# Altium footprint library North POLE.PcbLib: 419 footprints (part 5 of 27)
Each footprint in its own frame and in the unit in brackets; x right, y up, seen from the top. Pads: shape width x height; smd on the part's side, far side on the other; paste and mask are expansions set on the pad; w line width, h text height; cw(c..) or ccw(c..) is an arc to the next point about the centre after c.
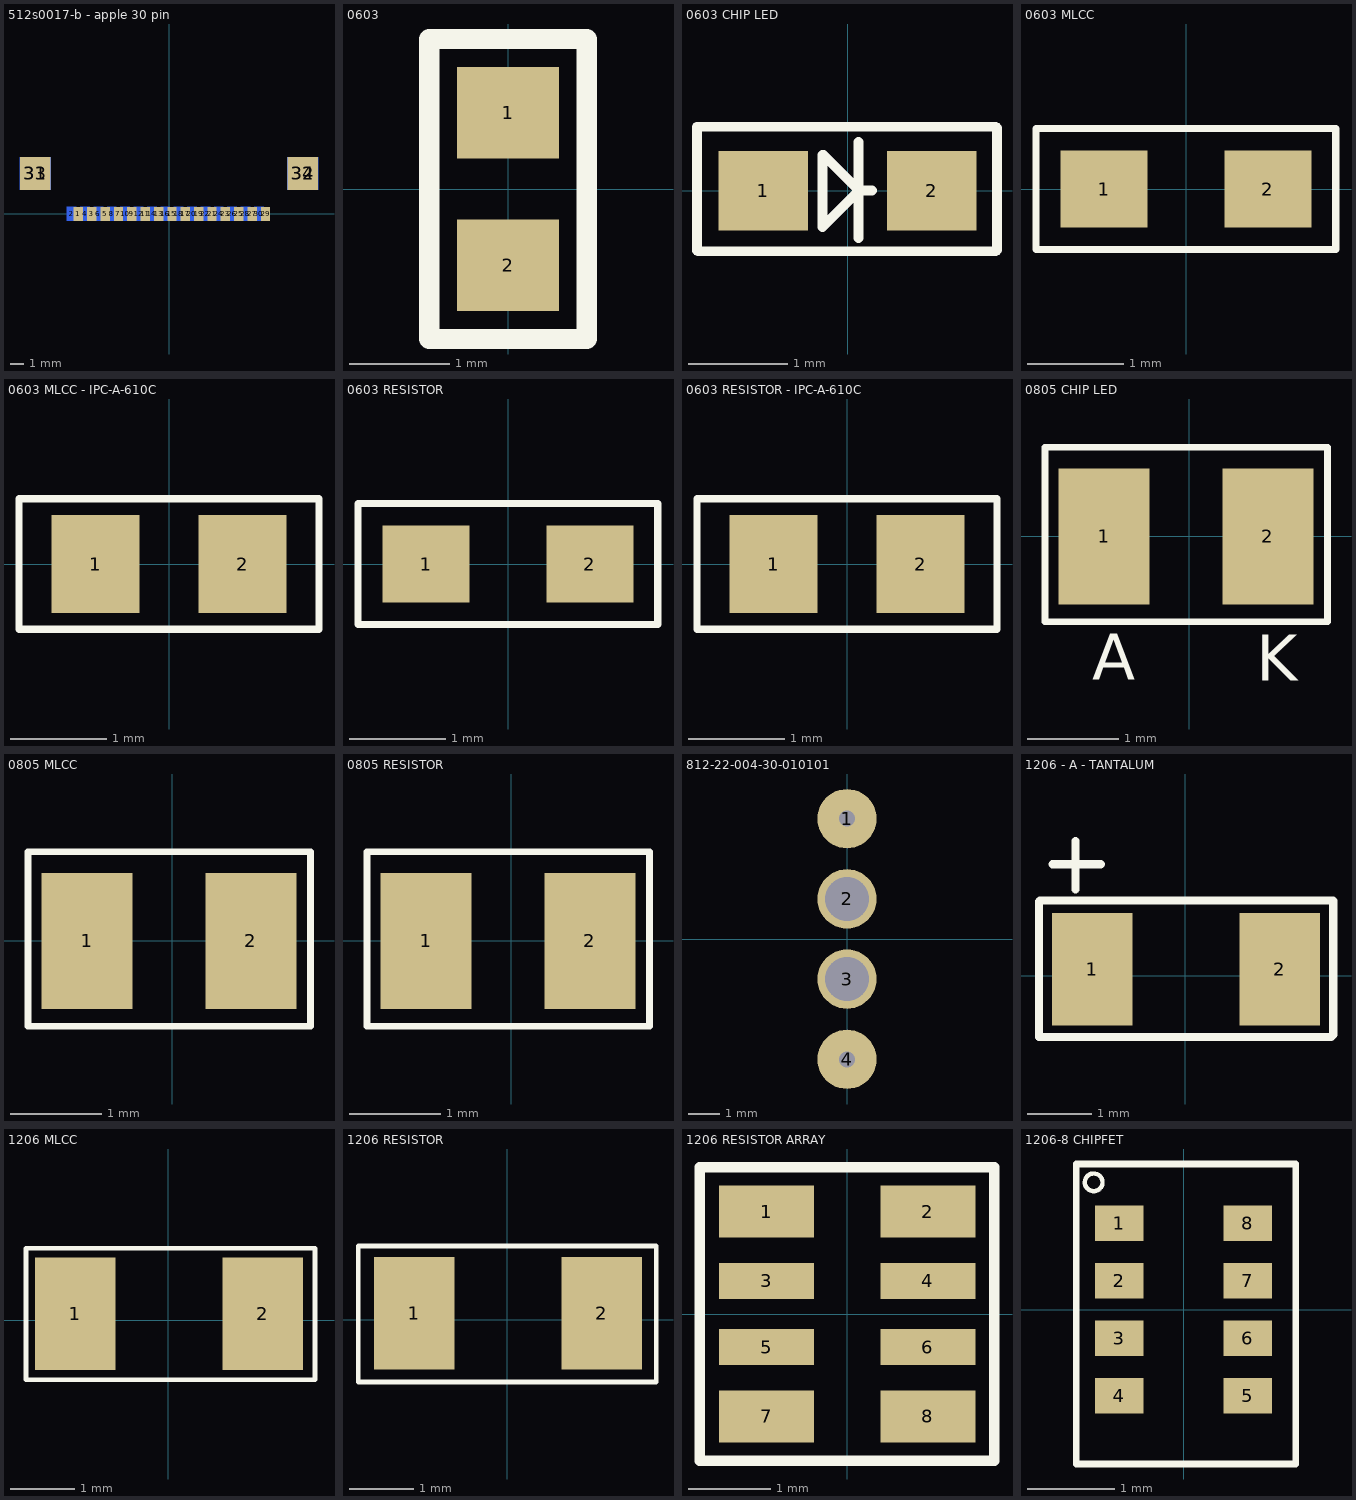
[diagram p4: the footprints below, top view; thin cyan lines are the x and y axes]

## 512s0017-b - apple 30 pin [mm]
pads (34):
  rect 0.7x1.05 smd mask+0.08: 1(-6.78,0) 3(-5.78,0) 5(-4.78,0) 7(-3.78,0) 9(-2.78,0) 11(-1.78,0) 13(-0.78,0) 15(0.22,0) 17(1.22,0) 19(2.22,0) 21(3.22,0) 23(4.22,0) 25(5.22,0) 27(6.22,0) 29(7.22,0)
  rect 0.7x1.05 smd far side mask+0.08: 2(-7.28,0) 4(-6.28,0) 6(-5.28,0) 8(-4.28,0) 10(-3.28,0) 12(-2.28,0) 14(-1.28,0) 16(-0.28,0) 18(0.72,0) 20(1.72,0) 22(2.72,0) 24(3.72,0) 26(4.72,0) 28(5.72,0) 30(6.72,0)
  rect 2.3x2.44 smd mask+0.08: 31(-10,3.015) 32(10,3.015)
  rect 2.3x2.44 smd far side mask+0.08: 33(-10,3.015) 34(10,3.015)
3D body: height 1.25, standoff -2.15, extent -11.285,-9.04 11.205,4.26

## 0603 [mil]
pads (2):
  rect 40x36 smd paste+0 mask+5: 1(0,30) 2(0,-30)
Top Overlay:
  lines w8: -31,-59 31,-59 31,59 -31,59 -31,-59

## 0603 CHIP LED [mm]
pads (2):
  rect 0.9x0.8 smd mask+0.08: 1(-0.85,0) 2(0.85,0)
Top Overlay:
  lines w0.1: 0.109,-0.478 0.109,0.49 ; 0.249,0.003 0.114,0.003 ; 0.114,0.003 -0.254,-0.366 -0.254,0.358 -0.241,0.358 0.114,0.003 ; -1.519,-0.605 -1.511,-0.612 1.496,-0.612 1.509,-0.599 1.509,0.632 1.496,0.645 -1.519,0.645 -1.519,-0.605
3D body: height 0.68, standoff 0, extent -0.82,-0.362 0.83,0.363

## 0603 MLCC [mm]
pads (2):
  rect 0.9x0.8 smd mask+0.08: 1(-0.85,0) 2(0.85,0)
Top Overlay:
  lines w0.076: 1.555,-0.626 1.555,0.627 -1.556,0.627 -1.556,-0.626 -1.555,-0.627 1.556,-0.627
3D body: height 0.89, standoff -0.01, extent -1.3,-0.508 1.3,0.492

## 0603 MLCC - IPC-A-610C [mil]
pads (2):
  rect 36x40 smd mask+3.15: 1(-30,0) 2(30,0)
Top Overlay:
  lines w3: -61.26,-26.57 -61.26,26.57 61.22,26.57 61.22,-26.57 -61.26,-26.57
3D body: height 35.04, standoff -0.39, extent -51.18,-20 51.18,19.37

## 0603 RESISTOR [mm]
pads (2):
  rect 0.9x0.8 smd mask+0.08: 1(-0.85,0) 2(0.85,0)
Top Overlay:
  lines w0.076: -1.556,-0.626 -1.556,0.627 1.555,0.627 1.555,-0.626 ; -1.555,-0.627 1.556,-0.627
3D body: height 0.53, standoff 0, extent -1.314,-0.506 1.286,0.494

## 0603 RESISTOR - IPC-A-610C [mil]
pads (2):
  rect 36x40 smd mask+3.15: 1(-30,0) 2(30,0)
Top Overlay:
  lines w3: -61.26,-26.57 61.22,-26.57 61.22,26.57 -61.26,26.57 -61.26,-26.57
3D body: height 20.79, standoff 0, extent -51.73,-19.92 50.64,19.45

## 0805 CHIP LED [mm]
pads (2):
  rect 1x1.5 smd mask+0.08: 1(-0.94,0) 2(0.864,0)
Top Overlay:
  lines w0.076: -1.592,-0.94 1.519,-0.94 1.519,0.982 -1.592,0.982 -1.592,-0.94
  text "K" at 0.733,-1.59 h0.51
  text "A" at -1.073,-1.58 h0.51
3D body: height 0.85, standoff 0.01, extent -0.988,-0.426 1.074,0.48

## 0805 MLCC [mm]
pads (2):
  rect 1x1.5 smd mask+0.08: 1(-0.94,0) 2(0.864,0)
Top Overlay:
  lines w0.076: -1.592,-0.94 1.519,-0.94 1.519,0.982 -1.592,0.982 -1.592,-0.94
3D body: height 0.93, standoff -0.01, extent -1.562,-0.708 1.438,0.692

## 0805 RESISTOR [mm]
pads (2):
  rect 1x1.5 smd mask+0.08: 1(-0.94,0) 2(0.864,0)
Top Overlay:
  lines w0.076: -1.592,-0.94 1.519,-0.94 1.519,0.982 -1.592,0.982 -1.592,-0.94
3D body: height 0.53, standoff 0, extent -1.465,-0.703 1.535,0.697

## 812-22-004-30-010101 [mil]
pads (4):
  round 74 hole 20 mask+1.57: 1(0,150) 4(0,-150)
  round 74 hole 55 mask+1.57: 2(0,50) 3(0,-50)

## 1206 - A - TANTALUM [mm]
pads (2):
  rect 1.25x1.75 smd mask+0.08: 1(-1.448,0.102) 2(1.473,0.102)
Top Overlay:
  lines w0.127: -2.068,1.737 -1.316,1.737 ; -1.707,1.346 -1.707,2.098 ; -2.276,-0.95 2.273,-0.95 2.306,-0.917 2.306,1.166 2.301,1.171 -2.263,1.171 -2.276,1.158 -2.276,-0.95
3D body: height 1.57, standoff -0.03, extent -1.523,-0.716 1.65,0.884

## 1206 MLCC [mm]
pads (2):
  rect 1.25x1.75 smd mask+0.08: 1(-1.448,0.102) 2(1.473,0.102)
Top Overlay:
  lines w0.076: -2.215,-0.924 -2.215,1.124 2.285,1.124 2.285,-0.924 -2.215,-0.924
3D body: height 0.95, standoff -0.01, extent -2.086,-0.787 2.114,1.013

## 1206 RESISTOR [mm]
pads (2):
  rect 1.25x1.75 smd mask+0.08: 1(-1.448,0.102) 2(1.473,0.102)
Top Overlay:
  lines w0.076: -2.319,-0.974 -2.319,1.148 2.321,1.148 2.321,-0.974 -2.319,-0.974
3D body: height 0.63, standoff 0, extent -2.081,-0.805 2.119,0.995

## 1206 RESISTOR ARRAY [mm]
pads (8):
  rect 1.15x0.63 smd mask+0.08: 1(-0.975,1.24) 2(0.975,1.24) 7(-0.975,-1.24) 8(0.975,-1.24)
  rect 1.15x0.44 smd mask+0.08: 3(-0.975,0.4) 4(0.975,0.4) 5(-0.975,-0.4) 6(0.975,-0.4)
Top Overlay:
  lines w0.127: -1.783,-1.773 -1.783,1.773 1.778,1.773 1.778,-1.773 -1.783,-1.773
3D body: height 0.5, standoff 0, extent -0.8,-1.6 0.8,1.6

## 1206-8 CHIPFET [mil]
pads (8):
  rect 22x16 smd mask+3.15: 1(-29,39) 2(-29,13) 3(-29,-13) 4(-29,-39) 5(29,-39) 6(29,-13) 7(29,13) 8(29,39)
Top Overlay:
  lines w2: -38.08,60.62 ccw(c-40.64,57.54) -37.68,60.24
  lines w3: -48.5,-69.88 -48.5,65.83 50.75,65.83 50.75,-69.88 -48.5,-69.88
3D body: height 39.37, standoff 0, extent -33.07,-60.51 33.07,61.3